# Altium footprint library FMU3_REV_D.PcbLib: 53 footprints (part 1 of 4)
Each footprint in its own frame and in the unit in brackets; x right, y up, seen from the top. Pads: shape width x height; smd on the part's side, far side on the other; paste and mask are expansions set on the pad; w line width, h text height; cw(c..) or ccw(c..) is an arc to the next point about the centre after c.
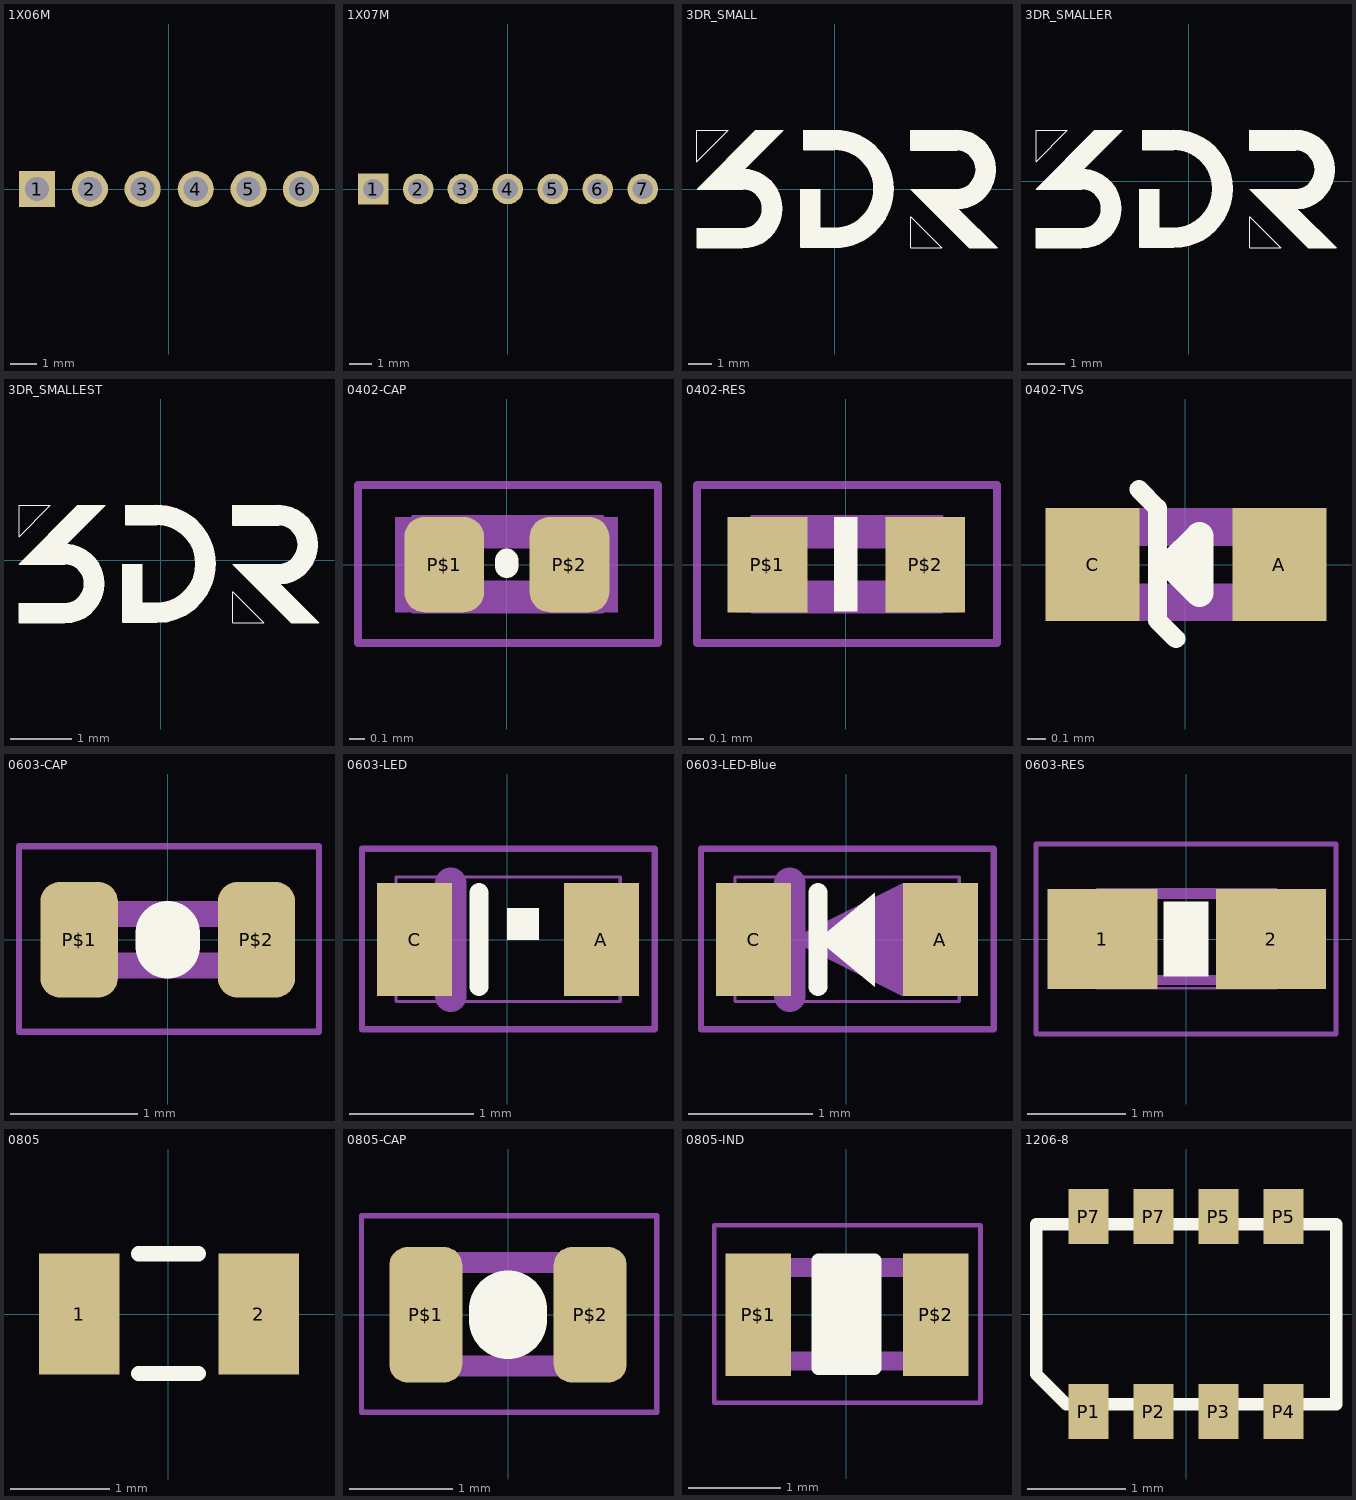
[diagram p0: the footprints below, top view; thin cyan lines are the x and y axes]

## 1X06M [mil]
pads (6):
  rect 54x54 hole 36: 1(-196.85,0)
  round 54 hole 36: 2(-118.11,0) 3(-39.37,0) 4(40,0) 5(119,0) 6(197,0)
Mechanical 16:
  rectangle: -127.95,-9.84 -108.27,10
  rectangle: -206.69,-9.84 -187.01,10
  region: 30.08,10.08 30.08,-9.92 49.92,-9.92 49.92,10.08
  region: -49.29,9.92 -49.29,-9.76 -29.45,-9.76 -29.45,9.92
  region: 187.58,9.58 187.58,-9.42 207.42,-9.42 207.42,9.58
  region: 108.58,9.58 108.58,-9.42 128.42,-9.42 128.42,9.58

## 1X07M [mil] "1X07M"
pads (7):
  rect 54x54 hole 36: 1(-236.22,0)
  round 54 hole 36: 2(-157.48,0) 3(-78.74,0) 4(0,0) 5(79,0) 6(158,0) 7(237,0)
Mechanical 16:
  region: 227.08,10.08 227.08,-9.92 246.92,-9.92 246.92,10.08
  region: 69.08,10.08 69.08,-9.92 88.92,-9.92 88.92,10.08
  region: 148.08,10.08 148.08,-9.92 167.92,-9.92 167.92,10.08
  region: -88.66,9.92 -88.66,-9.76 -68.82,-9.76 -68.82,9.92
  region: -9.84,10 -9.84,-9.84 10,-9.84 10,10
  rectangle: -246.06,-9.84 -226.38,10
  rectangle: -167.32,-9.84 -147.64,10
  region: 227.08,10.08 227.08,-9.92 246.92,-9.92 246.92,10.08
  region: 69.08,10.08 69.08,-9.92 88.92,-9.92 88.92,10.08
  region: 148.08,10.08 148.08,-9.92 167.92,-9.92 167.92,10.08
  region: -88.66,9.92 -88.66,-9.76 -68.82,-9.76 -68.82,9.92
  region: -9.84,10 -9.84,-9.84 10,-9.84 10,10
  rectangle: -246.06,-9.84 -226.38,10
  rectangle: -167.32,-9.84 -147.64,10

## 3DR_SMALL [mil]
Top Overlay:
  drawing of 45 lines, arcs and shapes, not listed
Top Solder:
  region: 182.63,-99.72 129.6,-99.72 129.6,-46.69
  region: -235.2,47.62 -235.2,100.65 -182.17,100.65

## 3DR_SMALLER [mil]
Top Overlay:
  drawing of 45 lines, arcs and shapes, not listed
Top Solder:
  region: -160.22,20.8 -160.22,53.38 -127.63,53.38
  region: 96.53,-69.74 63.94,-69.74 63.94,-37.15

## 3DR_SMALLEST [mil]
Top Overlay:
  drawing of 45 lines, arcs and shapes, not listed
Top Solder:
  region: 65.71,-39.75 45.92,-39.75 45.92,-19.96
  region: -90.23,15.24 -90.23,35.03 -70.44,35.03

## 0402-CAP [mil]
pads (2):
  rrect50% 20x24 smd mask+0: P$1(-15.75,0) P$2(15.75,0)
Top Overlay:
  lines w6: 0,-0.39 0,1
Mechanical 16:
  rectangle: 15.96,-12 27.96,12
  rectangle: -28.04,-12 -16.04,12
  lines w1: -23.62,-11.81 -23.62,12 24,12 24,-11.81 -23.62,-11.81
  lines w2: -37.4,-19.68 -37.4,20 38,20 38,-19.68 -37.4,-19.68
  lines w8: -20,-8 20,-8 ; -20,8 20,8
3D body: height 19.68, standoff 0, extent -19.69,-9.84 19.69,9.84

## 0402-RES [mil] "0402-RES"
height 66.93
pads (2):
  rect 20x24 smd: P$1(-19.68,0) P$2(20,0)
Top Overlay:
  rectangle: -3,-11.8 3,12.01
Mechanical 16:
  rectangle: -28,-12 -16,12
  rectangle: 16,-12 28,12
  lines w1: -23.62,-11.81 24,-11.81 24,12 -23.62,12 -23.62,-11.81
  lines w2: -37.4,-19.68 38,-19.68 38,20 -37.4,20 -37.4,-19.68
  lines w8: -20,-8 20,-8 ; -20,8 20,8
3D body: height 19.68, standoff 0, extent -19.69,-9.84 19.69,9.84

## 0402-TVS [mil] "0402-TVS"
pads (2):
  rect 20x24 smd: A(20,0) C(-19.68,0)
Top Overlay:
  lines w4: -9.84,16 -5.91,12 -5.91,-11.81 -1.97,-15.75
  lines w6: -3,0 3,6 3,0 ; -3,0 3,-6 3,0 ; -3,0 3,0
Mechanical 16:
  rectangle: -28,-12 -16,12
  rectangle: 16,-12 28,12
  lines w8: -20,-8 20,-8 ; -20,8 20,8
3D body: height 19.68, standoff 0, extent -19.69,-9.84 19.68,9.84

## 0603-CAP [mil] "0603-CAP"
pads (2):
  rrect50% 24x36 smd mask+0: P$1(-27.56,0) P$2(27.56,0)
Top Overlay:
  lines w20: 0,-2 0,2
Mechanical 16:
  rectangle: -28,-12 -16,12
  rectangle: 16,-12 28,12
  lines w2: -46.26,-28.54 47,-28.54 47,29 -46.26,29 -46.26,-28.54
  lines w8: -20,-8 20,-8 ; -20,8 20,8
3D body: height 34.25, standoff -0.39, extent -31.5,-15.95 31.5,15.94

## 0603-LED [mil]
pads (2):
  rect 24x36 smd: A(30,0) C(-29.53,0)
Top Overlay:
  region: 0,0 10,0 10,10 0,10
  lines w6: -9,-15 -9,15
Mechanical 16:
  region: 0,0 10,0 10,10 0,10
  lines w1: -35.43,-19.68 36,-19.68 36,20 -35.43,20 -35.43,-19.68
  lines w2: -46.26,-28.54 47,-28.54 47,29 -46.26,29 -46.26,-28.54
  lines w10: -18,-18 -18,18

## 0603-LED-Blue [mil] "0603-LED_Blue"
pads (2):
  rect 24x36 smd: A(30,0) C(-29.53,0)
Top Overlay:
  region: -9,0 9,15 9,-15
  lines w6: -9,-15 -9,15
Mechanical 16:
  region: -18,0 18,18 18,-18
  lines w1: -35.43,-19.68 -35.43,20 36,20 36,-19.68 -35.43,-19.68
  lines w2: -46.26,-28.54 -46.26,29 47,29 47,-28.54 -46.26,-28.54
  lines w10: -18,-18 -18,18
3D body: height 35.43, standoff 0, extent -33.46,-17.72 33.47,17.72

## 0603-RES [mil] "0603-RES"
pads (2):
  rect 44x40 smd: 1(-33.46,0) 2(34,0)
Top Overlay:
  rectangle: -9,-15 9,15
Mechanical 6:
  rectangle: -7.87,-11.81 8,12
Mechanical 16:
  rectangle: -33,-18.5 -13.31,19
  rectangle: 13,-18.5 33,19
  lines w1: -35.43,-19.68 36,-19.68 36,20 -35.43,20 -35.43,-19.68
  lines w2: -60,-38 60,-38 60,38 -60,38 -60,-38
  lines w4: -14.02,-16.5 15,-16.5 ; -14.02,18 15,18
3D body: height 34.25, standoff -0.39, extent -31.5,-15.94 31.5,15.95

## 0805 [mil] "0805"
pads (2):
  rect 32x48 smd: 1(-35.43,0) 2(36,0)
Top Overlay:
  lines w6: -11.81,-23.62 12,-23.62 ; -11.81,24 12,24
3D body: height 30.79, standoff 0, extent -39.37,-24.61 39.37,24.6

## 0805-CAP [mil]
pads (2):
  rrect50% 28x52 smd mask+0: P$1(-31.5,0) P$2(31.5,0)
Top Overlay:
  lines w30: 0,-2 0,2
Mechanical 16:
  rectangle: 24,-23.67 40,24
  rectangle: -39.37,-23.67 -23.62,24
  lines w2: -56.1,-37.4 -56.1,38 57,38 57,-37.4 -56.1,-37.4
  lines w8: -23.62,-19.68 24,-19.68 ; -23.62,20 24,20
3D body: height 30.79, standoff 0, extent -39.37,-24.6 39.37,24.6

## 0805-IND [mil]
pads (2):
  rect 28x52 smd: P$1(-37.4,0) P$2(38,0)
Top Overlay:
  rectangle: -11.76,-22.59 12,23
  lines w6: -11.76,-22.59 -11.76,23 12,23 12,-22.59 -11.76,-22.59
Mechanical 16:
  rectangle: -39.37,-23.67 -23.62,24
  rectangle: 24,-23.67 40,24
  lines w2: -56.1,-37.4 57,-37.4 57,38 -56.1,38 -56.1,-37.4
  lines w8: -23.62,-19.68 24,-19.68 ; -23.62,20 24,20

## 1206-8 [mil]
pads (8):
  rect 16x22 smd: P1(-39,-39) P2(-13,-39) P3(13,-39) P4(39,-39) P5(13,39) P5(39,39) P7(-39,39) P7(-13,39)
Top Overlay:
  lines w5: -60,-24 -48,-36 60,-36 60,36 -60,36 -60,-24